# Altium footprint library TX2-Baseboard.PcbLib: 47 footprints (part 1 of 3)
Each footprint in its own frame and in the unit in brackets; x right, y up, seen from the top. Pads: shape width x height; smd on the part's side, far side on the other; paste and mask are expansions set on the pad; w line width, h text height; cw(c..) or ccw(c..) is an arc to the next point about the centre after c.
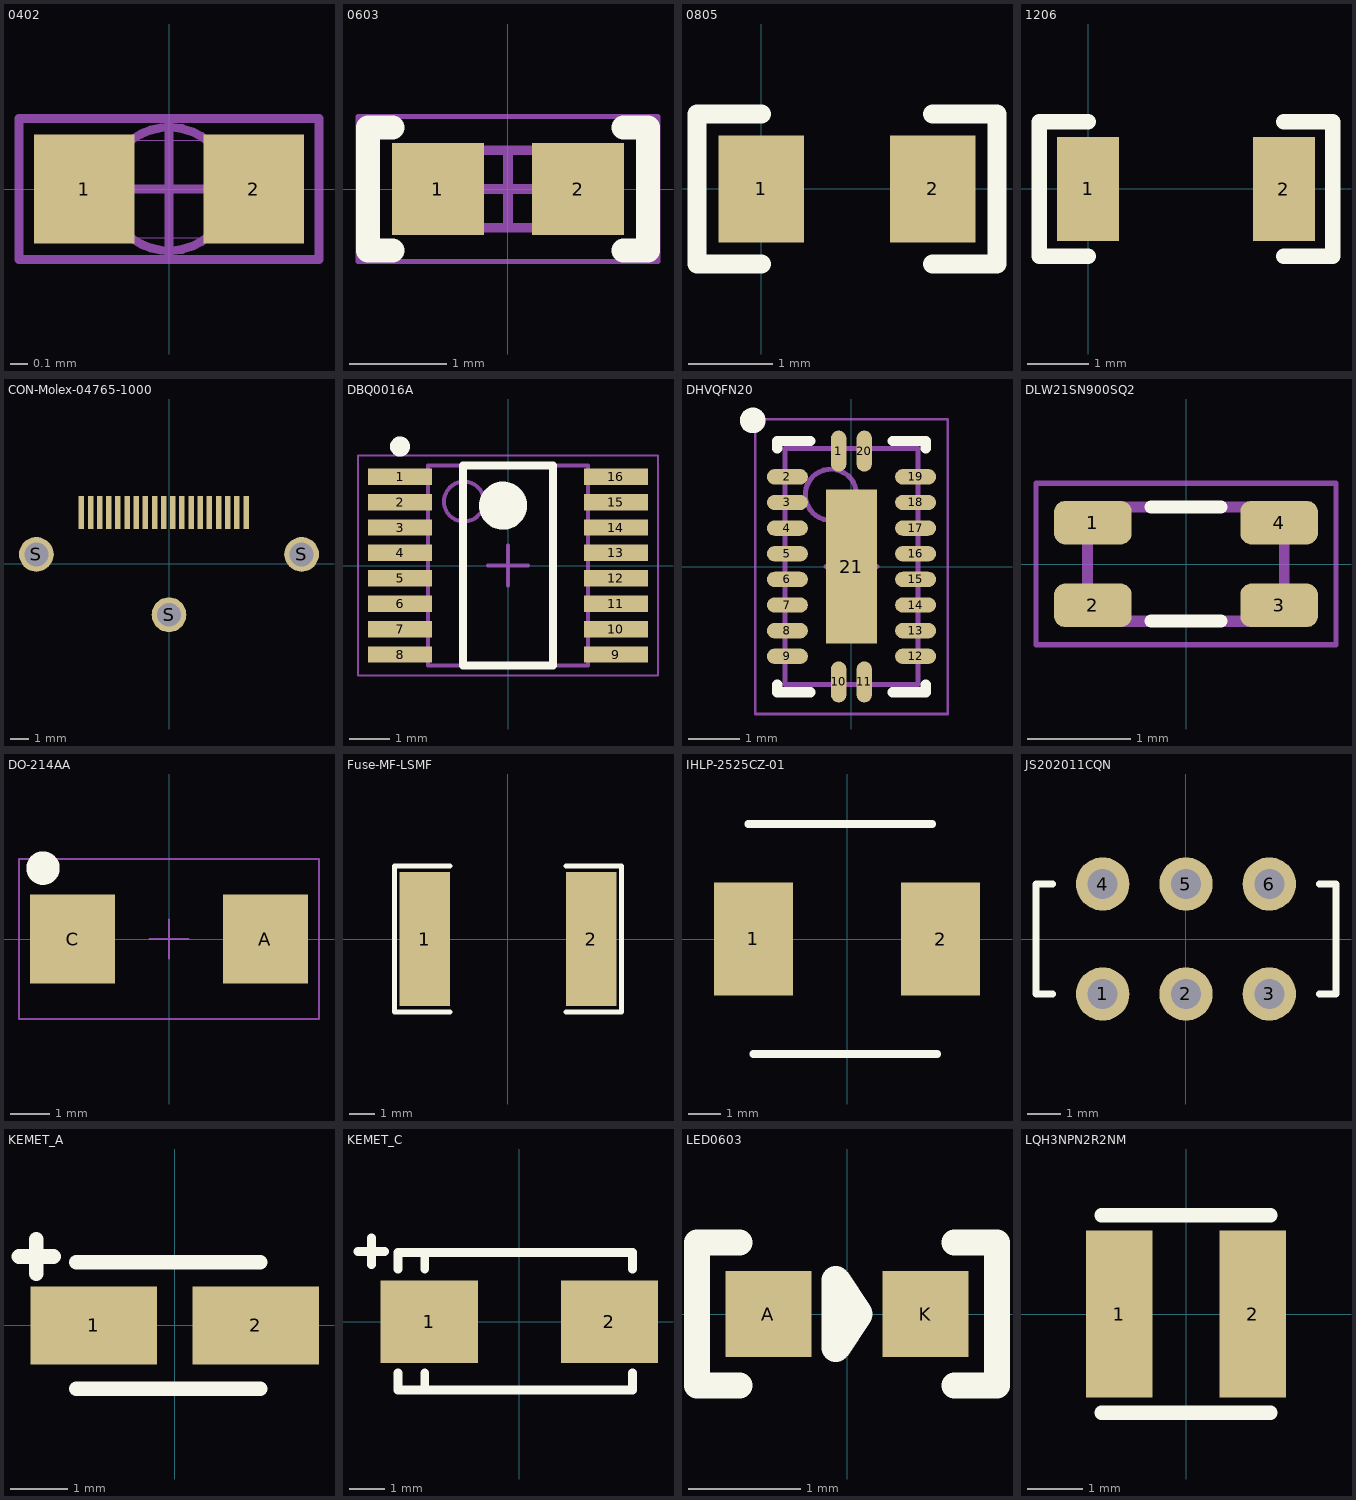
[diagram p0: the footprints below, top view; thin cyan lines are the x and y axes]

## 0402 [mm]
height 0.35
pads (2):
  rect 0.57x0.62 smd: 1(-0.48,0) 2(0.48,0)
Mechanical 3:
  circle w0.05: c0,0 r0.35
  lines w0.05: -0.5,0 0.5,0 ; 0,-0.4 0,0.4 ; -0.85,-0.4 0.85,-0.4 0.85,0.4 -0.85,0.4 -0.85,-0.4
Mechanical 13:
  lines w0.001: -0.525,-0.275 -0.525,0.275 0.525,0.275 0.525,-0.275 -0.525,-0.275
3D body: height 0.5, standoff 0, extent -0.55,-0.3 0.55,0.3

## 0603 [mm]
pads (2):
  rect 0.95x0.95 smd: 1(-0.725,0) 2(0.725,0)
Top Overlay:
  lines w0.25: -1.194,-0.635 -1.448,-0.635 -1.448,0.635 -1.194,0.635 ; 1.194,-0.635 1.448,-0.635 1.448,0.635 1.194,0.635
Mechanical 13:
  lines w0.1: -0.8,-0.4 0.8,-0.4 0.8,0.4 -0.8,0.4 -0.8,-0.4
Mechanical 15:
  lines w0.05: -1.55,-0.75 1.55,-0.75 1.55,0.75 -1.55,0.75 -1.55,-0.75
  lines w0.1: -0.4,0 0.4,0 ; 0,-0.4 0,0.4
3D body: height 0.45, standoff 0, extent 0.8,-0.4 0.8,0.4
3D body: height 0.45, standoff 0, extent -0.8,-0.4 -0.8,0.4
3D body: height 0.46, standoff -0.01, extent -0.824,-0.412 0.825,0.413

## 0805 [mil]
pads (2):
  rect 40x50 smd: 1(0,0) 2(80,0)
Top Overlay:
  lines w9: 0,-35 -30,-35 -30,35 0,35 ; 80,-35 110,-35 110,35 80,35
3D body: height 37.4, standoff 0, extent 0,-22.63 78.74,24.61

## 1206 [mm]
pads (2):
  rect 1.016x1.7 smd: 1(0,0) 2(3.2,0)
Top Overlay:
  lines w0.254: 0,-1.1 -0.8,-1.1 -0.8,1.1 0,1.1 ; 3.2,-1.1 4,-1.1 4,1.1 3.2,1.1
3D body: height 0.95, standoff -0.01, extent -0.477,-0.919 3.723,0.881

## CON-Molex-04765-1000 [mm]
pads (22):
  rect 0.3x1.8 smd: 1(4.21,2.8) 2(3.71,2.8) 3(3.21,2.8) 4(2.71,2.8) 5(2.21,2.8) 6(1.71,2.8) 7(1.21,2.8) 8(0.71,2.8) 9(0.21,2.8) 10(-0.29,2.8) 11(-0.79,2.8) 12(-1.29,2.8) 13(-1.79,2.8) 14(-2.29,2.8) 15(-2.79,2.8) 16(-3.29,2.8) 17(-3.79,2.8) 18(-4.29,2.8) 19(-4.79,2.8)
  round 1.9 hole 1.3: S(-7.25,0.5) S(0,-2.8) S(7.25,0.5)
3D body: height 9.56, standoff -3.18, extent -8.75,-4.464 8.75,3.488

## DBQ0016A [mm]
height 1.75
pads (16):
  rect 1.6x0.41 smd: 1(-2.7,2.222) 2(-2.7,1.587) 3(-2.7,0.953) 4(-2.7,0.318) 5(-2.7,-0.318) 6(-2.7,-0.953) 7(-2.7,-1.587) 8(-2.7,-2.222) 9(2.7,-2.222) 10(2.7,-1.587) 11(2.7,-0.953) 12(2.7,-0.318) 13(2.7,0.318) 14(2.7,0.953) 15(2.7,1.587) 16(2.7,2.222)
Top Overlay:
  circle w0.25: c-2.7,2.977 r0.125
  circle w0.6: c-0.125,1.5 r0.3
  lines w0.2: -1.125,-2.5 -1.125,2.5 1.125,2.5 1.125,-2.5 -1.125,-2.5
Mechanical 13:
  circle w0.1: c-1.1,1.6 r0.5
  lines w0.1: -2,-2.5 -2,2.5 2,2.5 2,-2.5 -2,-2.5
Mechanical 15:
  lines w0.05: -3.75,-2.75 -3.75,2.75 3.75,2.75 3.75,-2.75 -3.75,-2.75
  lines w0.1: -0.5,0 0.5,0 ; 0,-0.5 0,0.5
3D body: height 1.75, standoff 0.1, extent -2,-2.5 2,2.5

## DHVQFN20 [mm] "QFN, 20-Leads, Body 2,50x4,50mm, Pitch 0,50mm, Thermal Pad 1,00x3,00mm, IPC Medium Density"
height 1
pads (21):
  oval 0.3x0.8 smd: 1(-0.25,2.25) 10(-0.25,-2.25) 11(0.25,-2.25) 20(0.25,2.25)
  oval 0.8x0.3 smd: 2(-1.25,1.75) 3(-1.25,1.25) 4(-1.25,0.75) 5(-1.25,0.25) 6(-1.25,-0.25) 7(-1.25,-0.75) 8(-1.25,-1.25) 9(-1.25,-1.75) 12(1.25,-1.75) 13(1.25,-1.25) 14(1.25,-0.75) 15(1.25,-0.25) 16(1.25,0.25) 17(1.25,0.75) 18(1.25,1.25) 19(1.25,1.75)
  rect 1x3 smd: 21(0,0)
Top Overlay:
  circle w0.25: c-1.925,2.85 r0.125
  lines w0.2: -1.45,-2.3 -1.45,-2.45 -0.8,-2.45 ; -1.45,2.3 -1.45,2.45 -0.8,2.45 ; 0.8,-2.45 1.45,-2.45 1.45,-2.3 ; 0.8,2.45 1.45,2.45 1.45,2.3
Mechanical 13:
  circle w0.1: c-0.4,1.4 r0.5
  lines w0.1: -1.3,-2.3 1.3,-2.3 1.3,2.3 -1.3,2.3 -1.3,-2.3
Mechanical 15:
  lines w0.05: -1.875,-2.875 1.875,-2.875 1.875,2.875 -1.875,2.875 -1.875,-2.875
  lines w0.1: -0.5,0 0.5,0 ; 0,-0.5 0,0.5
3D body: height 1, standoff 0.05, extent -1.3,-2.3 1.3,2.3

## DLW21SN900SQ2 [mm]
pads (4):
  rrect50% 0.75x0.42 smd: 1(-0.9,0.4) 2(-0.9,-0.4) 3(0.9,-0.4) 4(0.9,0.4)
Top Overlay:
  lines w0.127: -0.34,-0.55 0.34,-0.55 ; -0.34,0.55 0.34,0.55
Mechanical 2:
  lines w0.001: -1,-0.6 1,-0.6 1,0.6 -1,0.6 -1,-0.6
Mechanical 3:
  lines w0.05: -1.45,-0.78 1.45,-0.78 1.45,0.78 -1.45,0.78 -1.45,-0.78
  lines w0.1: -0.95,-0.55 0.95,-0.55 0.95,0.55 -0.95,0.55 -0.95,-0.55
3D body: height 1.2, standoff 0, extent -1,-0.6 1,0.6

## DO-214AA [mm]
pads (2):
  rect 2.16x2.26 smd: A(2.45,0) C(-2.45,0)
Top Overlay:
  circle w0.5: c-3.2,1.8 r0.175
Mechanical 15:
  lines w0.051: -0.5,0 0.5,0 ; 0,-0.5 0,0.5 ; -3.81,-2.032 3.81,-2.032 3.81,2.032 -3.81,2.032 -3.81,-2.032
3D body: height 2.45, standoff 0.03, extent -2.75,-1.95 2.75,1.95

## Fuse-MF-LSMF [mm]
pads (2):
  rect 2x5.3 smd: 1(-3.3,0) 2(3.3,0)
Top Overlay:
  lines w0.2: -2.3,-2.9 -4.5,-2.9 -4.5,2.9 -2.3,2.9 ; 2.3,-2.9 4.5,-2.9 4.5,1.9 4.5,2.9 2.3,2.9
3D body: height 0.6, standoff 0, extent -3.667,-2.56 3.668,2.56

## IHLP-2525CZ-01 [mm]
pads (2):
  rect 2.4x3.43 smd: 1(-2.85,0) 2(2.85,0)
Top Overlay:
  lines w0.229: -3,3.5 2.6,3.5 ; -2.85,-3.5 2.75,-3.5
3D body: height 3, standoff 0, extent -3.25,-3.25 3.25,3.25

## JS202011CQN [mm]
pads (6):
  round 1.6 hole 0.9: 1(-2.5,-1.65) 2(0,-1.65) 3(2.5,-1.65) 4(-2.5,1.65) 5(0,1.65) 6(2.5,1.65)
Top Overlay:
  lines w0.2: -4,-1.65 -4.5,-1.65 -4.5,0.05 -4.5,1.65 -4,1.65 ; 4,-1.65 4.5,-1.65 4.5,0.05 4.5,1.65 4,1.65
3D body: height 5.22, standoff -3.28, extent -4.5,-1.8 4.5,1.8

## KEMET_A [mm] "Kemet A size package. Low desity level"
height 1.6
pads (2):
  rect 2.2x1.35 smd: 1(-1.41,0) 2(1.41,0)
Top Overlay:
  lines w0.254: -2.71,1.2 -2.11,1.2 ; -2.41,0.9 -2.41,1.5 ; -1.71,-1.1 1.49,-1.1 ; -1.71,1.1 1.49,1.1
3D body: height 1.81, standoff 0.01, extent -1.81,-0.9 1.59,0.9

## KEMET_C [mm] "Kemet C size package. Low desity level"
height 2.5
pads (2):
  rect 2.77x2.35 smd: 1(-2.57,0) 2(2.57,0)
Top Overlay:
  lines w0.254: -4.601,2 -3.839,2 ; -4.22,1.619 -4.22,2.381 ; -3.458,-1.467 -3.458,-1.95 3.23,-1.95 3.23,-1.467 ; -3.458,1.492 -3.458,1.975 3.23,1.975 3.23,1.492 ; -2.696,-1.925 -2.696,-1.467 ; -2.696,1.492 -2.696,1.95
3D body: height 2.81, standoff 0.01, extent -3.245,-1.725 3.055,1.775

## LED0603 [mil]
pads (2):
  rect 30x30 smd: A(-27.5,0) K(27.5,0)
Top Overlay:
  lines w9: -37.5,-25 -52.5,-25 -52.5,25 -37.5,25 ; 37.5,-25 52.5,-25 52.5,25 37.5,25
  lines w10: -3.88,-11.81 4,0 -3.88,11.81 -3.88,-11.81
3D body: height 43.31, standoff 0, extent -31.83,-15.75 31.95,15.74

## LQH3NPN2R2NM [mm]
height 1.4
pads (2):
  rect 1.2x3 smd: 1(-1.2,0) 2(1.2,0)
Top Overlay:
  lines w0.254: -1.524,-1.778 1.524,-1.778 ; -1.524,1.778 1.524,1.778
3D body: height 1.4, standoff 0.1, extent -1.524,-1.524 1.524,1.651